# Altium integrated library Mastermind Devices.IntLib: 910 symbols (part 2 of 6)

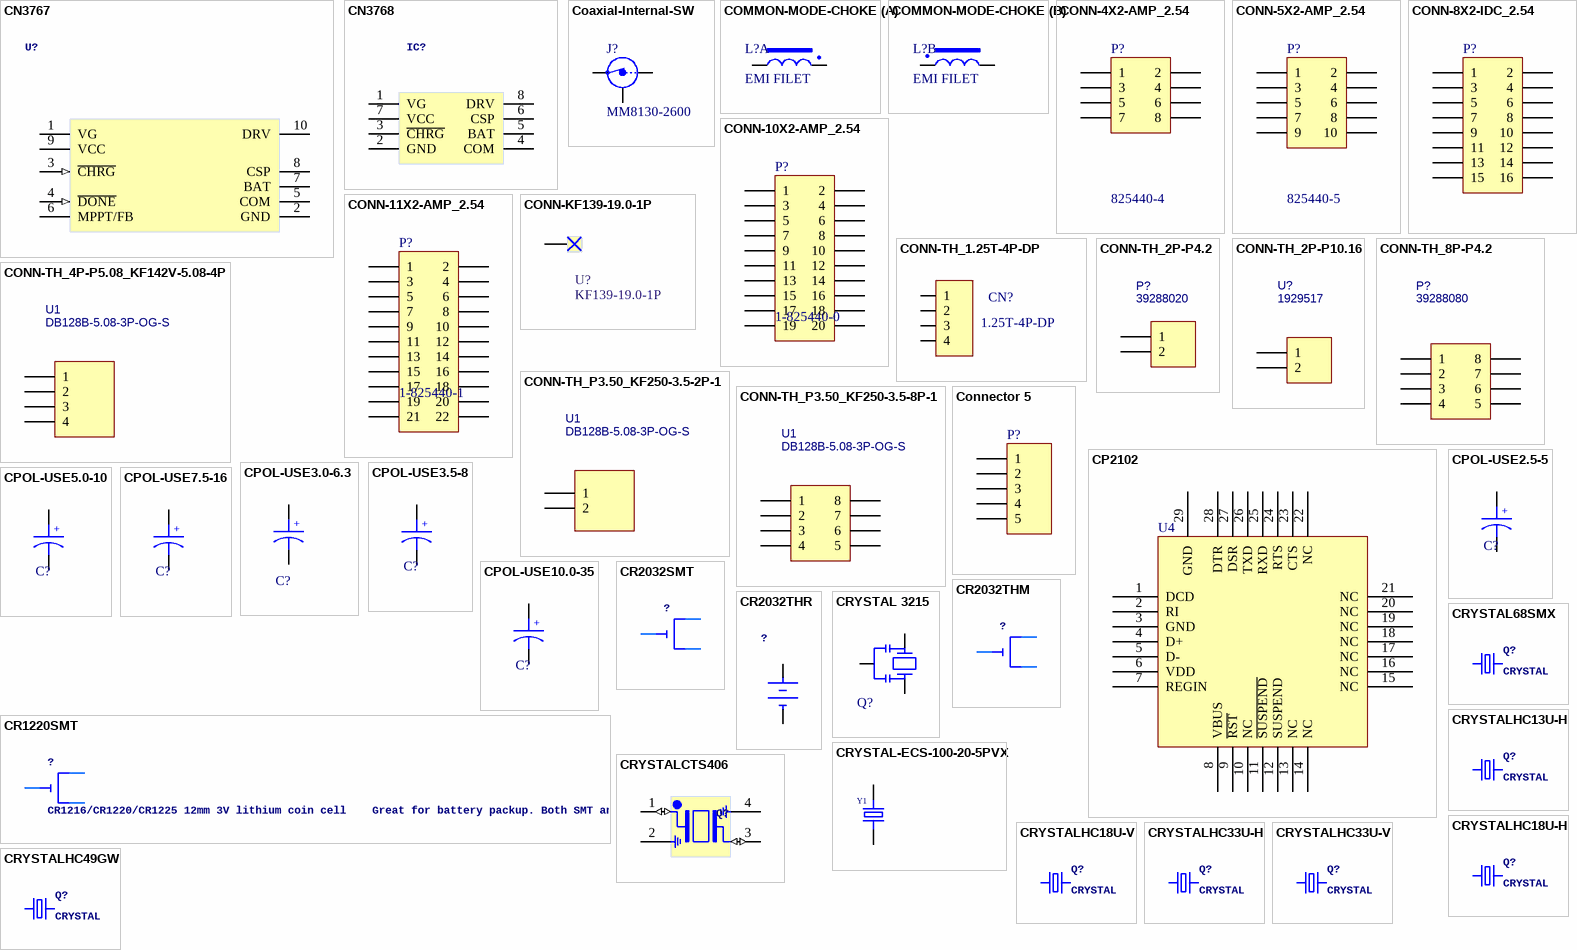
[diagram p8: symbols CN3767 to CRYSTALHC49GW]

## CN3767
designator U?, comment Battey Charger  (value not drawn)
footprint SOIC10 0P600X175-10N
pins: 1 VG, 2 GND, 3 ~{CHRG} (in), 4 ~{DONE} (in), 5 COM (power), 6 MPPT/FB, 7 BAT, 8 CSP (power), 9 VCC, 10 DRV (power)

## CN3768
designator IC?, comment Battey Charger  (value not drawn)
footprint SOP8
pins: 1 VG, 2 GND, 3 ~{CHRG}, 4 COM (power), 5 BAT, 6 CSP (power), 7 VCC, 8 DRV (power)

## Coaxial-Internal-SW
designator J?, comment MM8130-2600
Coaxial Connector with Switch; Manufacturer: Murata; 2nd source part number: 81-MM8130-2600RA2; Artikkelnr Noca: 55029011; Artikkelnr Simpro: N.A.; Part Number: MM8130-2600; Manufacturer Part Number: MM8130-2600; Datasheet: http://www.murata.com/products/catalog/pdf/o33e.pdf; LatestRevisionDate: 2014-04-24; Pin Count: 3; Publisher: Nordic Semiconductor; Published: 2014-04-24; Value: MM8130-2600; Note: *; Supplier: Digi-Key; Supplier part number: 490-4981-1-ND; 2nd source Supplier: Mouser; Footprint Doc: COAXIAL-SWF
footprint COAXIAL-SWF
pins: 1 IN, 2 Shield, 3 OUT

## COMMON-MODE-CHOKE
designator L?, comment EMI FILET
Common Mode Noise Filter
footprint EMI Core
footprint EMI Z0021A
footprint COMMON-IND_30.0
part A pins: 1, 3
part B pins: 2, 4

## CONN-4X2-AMP_2.54
designator P?, comment 825440-4
TE Connectivity AMP Connectors; LatestRevisionDate: 17-Jul-2002; LatestRevisionNote: Re-released for DXP Platform.; Publisher: Altium Limited
signal-integrity model Connector
footprint CONN2X4-AMP (Connector; Header; 5x2 Position)
pins: 1, 2, 3, 4, 5, 6, 7, 8

## CONN-5X2-AMP_2.54
designator P?, comment 825440-5
TE Connectivity AMP Connectors; LatestRevisionDate: 17-Jul-2002; LatestRevisionNote: Re-released for DXP Platform.; Publisher: Altium Limited
signal-integrity model Connector
footprint CONN2X5-AMP (Connector; Header; 5x2 Position)
pins: 1, 2, 3, 4, 5, 6, 7, 8, 9, 10

## CONN-8X2-IDC_2.54
designator P?
IDC Connector; LatestRevisionDate: 17-Jul-2002; LatestRevisionNote: Re-released for DXP Platform.; Publisher: Altium Limited
signal-integrity model Connector
footprint 2X08_SHROUDED
pins: 1, 2, 3, 4, 5, 6, 7, 8, 9, 10, 11, 12, 13, 14, 15, 16

## CONN-10X2-AMP_2.54
designator P?, comment 1-825440-0
TE Connectivity AMP Connectors; LatestRevisionDate: 17-Jul-2002; LatestRevisionNote: Re-released for DXP Platform.; Publisher: Altium Limited
signal-integrity model Connector
footprint CONN2X10-AMP
pins: 1, 2, 3, 4, 5, 6, 7, 8, 9, 10, 11, 12, 13, 14, 15, 16, 17, 18, 19, 20

## CONN-11X2-AMP_2.54
designator P?, comment 1-825440-1
TE Connectivity AMP Connectors; LatestRevisionDate: 17-Jul-2002; LatestRevisionNote: Re-released for DXP Platform.; Publisher: Altium Limited
signal-integrity model Connector
footprint CONN2X11-AMP
pins: 1, 2, 3, 4, 5, 6, 7, 8, 9, 10, 11, 12, 13, 14, 15, 16, 17, 18, 19, 20, 21, 22

## CONN-KF139-19.0-1P
designator U?, comment KF139-19.0-1P
Manufacturer: KEFA(科发); Add into BOM: yes; Symbol: KF139-19.0-1P; Device: KF139-19.0-1P; LCSC Part Name: KF139-19.0-1P; Supplier Part: C6392812; Manufacturer Part: KF139-19.0-1P; Supplier Footprint: 插件; JLCPCB Part Class: Extended Part; Datasheet: https://atta.szlcsc.com/upload/public/pdf/source/20230523/9EEA11B50F6D876494A3C4E93D93D143.pdf; Supplier: LCSC; Convert to PCB: yes
footprint CONN-TH_KF139-19.0-1P
pins: 1

## CONN-TH_1.25T-4P-DP
designator CN?, comment 1.25T-4P-DP
CONN-TH_4P-P1.25_1.25T-4P-DP; Manufacturer: 韩国韩荣; Add into BOM: yes; Pins Structure: 1x4P; Pitch: 1.25mm; Number of PINs Per Row: 4; Symbol: 1.25T-4P-DP; Device: 1.25T-4P-DP; LCSC Part Name: 1x4P 间距:1.25mm; Supplier Part: C145936; Manufacturer Part: 1.25T-4P-DP; Supplier Footprint: 插件,P=1.25mm; JLCPCB Part Class: Extended Part; Datasheet: https://atta.szlcsc.com/upload/public/pdf/source/20210511/C145936_7E552BBBEA0510A148F12D708BF3BB1D.pdf; Supplier: LCSC; Convert to PCB: yes; Mounting Style: -; Reference Series: -; Number of Pins: 4P; Number of Rows: 1; Row Spacing: -; Contact Material: Phosphor bronze
footprint CONN-TH_4P-P1.25_1.25T-4P-DP
pins: 1, 2, 3, 4

## CONN-TH_2P-P4.2
designator P?, comment 39288020
MOLEX Pow CONN; Contributor: LCSC; Supplier: LCSC; Supplier Part: C490534; Manufacturer: MOLEX; Manufacturer Part: 39288020; JLCPCB Part Class: Extended Part; spicePre: C; spiceSymbolName: 39288020
footprint CONN-TH_39288020
pins: 1, 2

## CONN-TH_2P-P10.16
designator U?, comment 1929517
60A 600V Green Straight 10.16mm 1 2 Plugin,P=10.16mm Screw terminal ROHS; BOM_Manufacturer: DIBO; BOM_Manufacturer Part: DB128B-5.08-3P-OG-S; Contributor: LCSC; BOM_Supplier: LCSC; BOM_Supplier Part: C500034; BOM_JLCPCB Part Class: Extended Part; spicePre: U; spiceSymbolName: DB128B-5.08-3P-OG-S
footprint CONN-TH_KF139-19.0-2P
pins: 1, 2

## CONN-TH_4P-P5.08_KF142V-5.08-4P
designator U1, comment DB128B-5.08-3P-OG-S
BOM_Manufacturer: DIBO; Contributor: LCSC; BOM_Supplier: LCSC; BOM_Supplier Part: C500034; BOM_Manufacturer Part: DB128B-5.08-3P-OG-S; BOM_JLCPCB Part Class: Extended Part; spicePre: U; spiceSymbolName: DB128B-5.08-3P-OG-S
footprint CONN-TH_4P-P5.08_KF142V-5.08-4P
pins: 1, 2, 3, 4

## CONN-TH_8P-P4.2
designator P?, comment 39288080
Molex POW CONN; Contributor: LCSC; Supplier: LCSC; Supplier Part: C505059; Manufacturer: MOLEX; Manufacturer Part: 39288080; JLCPCB Part Class: Extended Part; spicePre: C; spiceSymbolName: 39288080
footprint CONN-TH_39288080
pins: 1, 2, 3, 4, 5, 6, 7, 8

## CONN-TH_P3.50_KF250-3.5-2P-1
designator U1, comment DB128B-5.08-3P-OG-S
BOM_Manufacturer: DIBO; Contributor: LCSC; BOM_Supplier: LCSC; BOM_Supplier Part: C500034; BOM_Manufacturer Part: DB128B-5.08-3P-OG-S; BOM_JLCPCB Part Class: Extended Part; spicePre: U; spiceSymbolName: DB128B-5.08-3P-OG-S
footprint CONN-TH_P3.50_KF250-3.5-2P-1
pins: 1, 2

## CONN-TH_P3.50_KF250-3.5-8P-1
designator U1, comment DB128B-5.08-3P-OG-S
BOM_Manufacturer: DIBO; Contributor: LCSC; BOM_Supplier: LCSC; BOM_Supplier Part: C500034; BOM_Manufacturer Part: DB128B-5.08-3P-OG-S; BOM_JLCPCB Part Class: Extended Part; spicePre: U; spiceSymbolName: DB128B-5.08-3P-OG-S
footprint CONN-TH_8P-P2.54_KF141V-2.54-8P
pins: 1, 2, 3, 4, 5, 6, 7, 8

## Connector 5
designator P?
XH Header Male Pin 0.100; LatestRevisionDate: 17-Jul-2002; LatestRevisionNote: Re-released for DXP Platform.; Publisher: Altium Limited; JLCPCB#: C146121
signal-integrity model Connector
footprint JST-5-PTH-KIT
footprint JST-5-PTH-ST
footprint JST-5-PTH-KIT - SMD
pins: 1, 2, 3, 4, 5

## CP2102
designator U4
CP2102
footprint QFN28
pins: 1 DCD, 2 RI, 3 GND, 4 D+, 5 D-, 6 VDD, 7 REGIN, 8 VBUS, 9 ~{RST}, 10 NC, 11 ~{SUSPEND}, 12 SUSPEND, 13 NC, 14 NC, 15 NC, 16 NC, 17 NC, 18 NC, 19 NC, 20 NC, 21 NC, 22 NC, 23 CTS, 24 RTS, 25 RXD, 26 TXD, 27 DSR, 28 DTR, 29 GND

## CPOL-USE2.5-5
designator C?, comment 47uF  (value not drawn)
footprint E2,5-5
pins: +, -

## CPOL-USE3.0-6.3
designator C?, comment 47uF  (value not drawn)
footprint E2,5-6.3
pins: +, -

## CPOL-USE3.5-8
designator C?, comment 1000Uf  (value not drawn)
footprint E3,5-8
footprint E3,17-8 -NoOutline
pins: +, -

## CPOL-USE5.0-10
designator C?, comment 10uF  (value not drawn)
footprint E3,5-10
pins: +, -

## CPOL-USE7.5-16
designator C?, comment 10uF  (value not drawn)
footprint E7.5-16
pins: +, -

## CPOL-USE10.0-35
designator C?, comment 10uF  (value not drawn)
footprint E10-35
footprint E10-35-Generic
pins: +, -

## CR1220SMT
designator ?, comment CR1216/CR1220/CR1225 12mm 3V lithium coin cell    Great for battery packup. Both SMT and THM holders.  Note the THM package has the ground pads on both sides of the PCB so that the masks are the same - this reduces the cost
footprint CR1220-SMD
pins: +$1 +, +$2 +1, -

## CR2032SMT
designator ?
footprint CR2032-SMD
pins: +$1 +, +$2 +1, -

## CR2032THM
designator ?
footprint CR2032-THRU
footprint CR2032_HOLDER_SMD
pins: +, +, -

## CR2032THR
designator ?
footprint CR2032_HOLDER_SMD
footprint CR2032-THRUHOLE
pins: +, -

## CRYSTAL68SMX
designator Q?, comment CRYSTAL
OC_FARNELL: 6344860; OC_NEWARK: unknown
footprint 86SMX
pins: 1, 4 2

## CRYSTAL 3215
designator Q?, comment 16MHz  (value not drawn)
Crystal Osscilator; OC_FARNELL: unknown; OC_NEWARK: unknown
footprint CSTCE16M 3215
pins: 1, 2, 3

## CRYSTAL-ECS-100-20-5PVX
designator Y1, comment crystal  (value not drawn)
10MHz Â±30ppm Crystal 20pF 60 Ohms HC-49/US; MP: ECS-100-20-5PVX; MF: ECS Inc.; Availability: Warning; SnapEDA_Link: https://www.snapeda.com/parts/ECS-100-20-5PVX/ECS%20Inc./view-part/2721546/?ref=snap; Value: *; Price: None; Package: HC49/US ECS International; Check_prices: https://www.snapeda.com/parts/ECS-100-20-5PVX/ECS%20Inc./view-part/2721546/?ref=eda
footprint HC-49US_L11.5-W4.5-P4.88
footprint OSC-SMD_2P-L5.0-W3.2
footprint XTAL1
pins: 1, 2

## CRYSTALCTS406
designator Q?, comment CRYSTAL  (value not drawn)
CRYSTALCTS406; OC_FARNELL: unknown; OC_NEWARK: unknown; Parameter 1: *
footprint 3225
footprint CRYSTAL-SMD_4P-L3.2-W2.5-BL-2
footprint OSC-SMD_4P-L2.0-W1.6-BL
footprint CRYSTAL-SMD_4P-L2.5-W2.0-BL-A
pins: 1 IN (io), 2 GND, 3 OUT (io), 4 GND

## CRYSTALHC13U-H
designator Q?, comment CRYSTAL
OC_FARNELL: unknown; OC_NEWARK: unknown
footprint HC13U-H
pins: 1, 2

## CRYSTALHC18U-H
designator Q?, comment CRYSTAL
OC_FARNELL: unknown; OC_NEWARK: unknown
footprint HC18U-H
pins: 1, 2

## CRYSTALHC18U-V
designator Q?, comment CRYSTAL
OC_FARNELL: unknown; OC_NEWARK: unknown
footprint HC18U-V
pins: 1, 2

## CRYSTALHC33U-H
designator Q?, comment CRYSTAL
OC_FARNELL: unknown; OC_NEWARK: unknown
footprint HC33U-H
pins: 1, 2

## CRYSTALHC33U-V
designator Q?, comment CRYSTAL
OC_FARNELL: unknown; OC_NEWARK: unknown
footprint HC33U-V
pins: 1, 2

## CRYSTALHC49GW
designator Q?, comment CRYSTAL
OC_FARNELL: unknown; OC_NEWARK: unknown
footprint HC49GW
pins: 1, 2

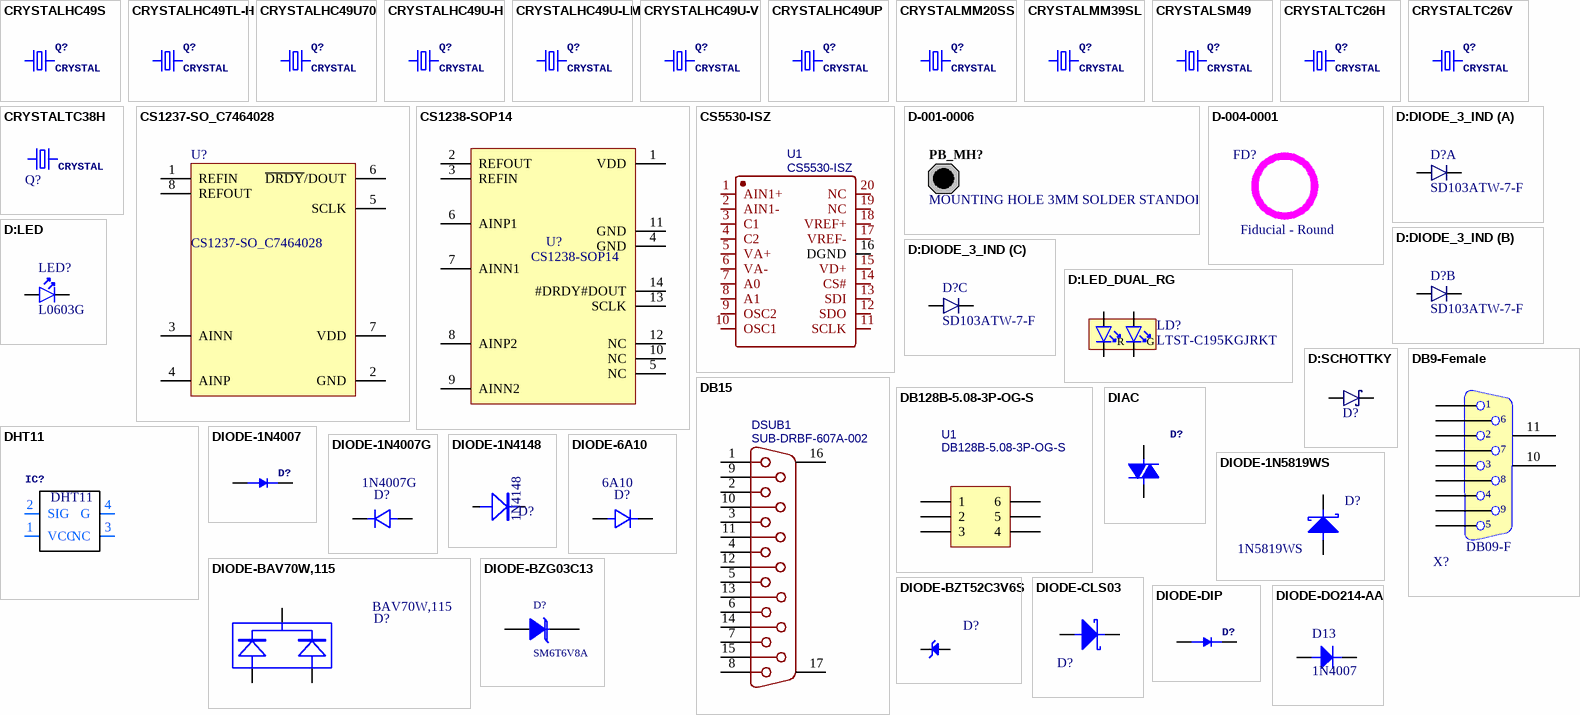
[diagram p9: symbols CRYSTALHC49S to DIODE-DO214-AA]

## CRYSTALHC49S
designator Q?, comment CRYSTAL
OC_FARNELL: 1667008; OC_NEWARK: unknown
footprint HC49/S
pins: 1, 2

## CRYSTALHC49TL-H
designator Q?, comment CRYSTAL
OC_FARNELL: unknown; OC_NEWARK: unknown
footprint HC49TL-H
pins: 1, 2

## CRYSTALHC49U70
designator Q?, comment CRYSTAL
OC_FARNELL: unknown; OC_NEWARK: unknown
footprint HC49U70
pins: 1, 2

## CRYSTALHC49U-H
designator Q?, comment CRYSTAL
OC_FARNELL: 1666973; OC_NEWARK: unknown
footprint HC49U-H
pins: 1, 2

## CRYSTALHC49U-LM
designator Q?, comment CRYSTAL
OC_FARNELL: 1666956; OC_NEWARK: unknown
footprint HC49U-LM
pins: 1, 2

## CRYSTALHC49U-V
designator Q?, comment CRYSTAL
OC_FARNELL: 1666969; OC_NEWARK: unknown
footprint HC49U-V
pins: 1, 2

## CRYSTALHC49UP
designator Q?, comment CRYSTAL
OC_FARNELL: unknown; OC_NEWARK: unknown
footprint HC49UP
pins: 1, 2

## CRYSTALMM20SS
designator Q?, comment CRYSTAL
OC_FARNELL: unknown; OC_NEWARK: unknown
footprint MM20SS
pins: 1, 4 2

## CRYSTALMM39SL
designator Q?, comment CRYSTAL
OC_FARNELL: unknown; OC_NEWARK: unknown
footprint MM39SL
pins: 1, 4 2

## CRYSTALSM49
designator Q?, comment CRYSTAL
OC_FARNELL: unknown; OC_NEWARK: unknown
footprint SM49
pins: 1, 2

## CRYSTALTC26H
designator Q?, comment CRYSTAL
OC_FARNELL: unknown; OC_NEWARK: unknown
footprint TC26H
pins: 1, 2

## CRYSTALTC26V
designator Q?, comment CRYSTAL
OC_FARNELL: unknown; OC_NEWARK: unknown
footprint TC26V
pins: 1, 2

## CRYSTALTC38H
designator Q?, comment CRYSTAL
OC_FARNELL: unknown; OC_NEWARK: unknown
footprint TC38H
footprint TC38H - SMD
pins: 1, 2

## CS1237-SO_C7464028
designator U?
CS1237 24-Bit High Precision ADC with Delta-Sigma Modulator; Manufacturer: CHIPSEA(芯海科技); Contributor: lcsc; Supplier: LCSC; Supplier Part: C7464028; Manufacturer Part: CS1237-SO; JLCPCB Part Class: Extended Part; spicePre: U; spiceSymbolName: CS1237-SO_C7464028
footprint SOIC-8E (SOIC, 8-Leads, Body 4.90x3.90mm, Pitch 1.27mm, IPC Medium Density)
pins: 1 REFIN, 2 GND, 3 AINN, 4 AINP, 5 SCLK, 6 ~{DRDY}/DOUT, 7 VDD, 8 REFOUT

## CS1238-SOP14
designator U?
Manufacturer: CHIPSEA(芯海科技); Symbol: CS1238; Add into BOM: yes; Device: CS1238-SOP14; LCSC Part Name: CS1238-SO; Supplier Part: C81829; Manufacturer Part: CS1238-SOP14; Supplier Footprint: SOP-14; JLCPCB Part Class: Extended Part; Datasheet: https://atta.szlcsc.com/upload/public/pdf/source/20160919/1474265371144.pdf; Supplier: LCSC; Convert to PCB: yes
footprint SOP-14_L8.6-W3.9-P1.27-LS6.0-BL
pins: 1 VDD, 2 REFOUT, 3 REFIN, 4 GND, 5 NC, 6 AINP1, 7 AINN1, 8 AINP2, 9 AINN2, 10 NC, 11 GND, 12 NC, 13 SCLK, 14 #DRDY#DOUT

## CS5530-ISZ
designator U1
BOM_Manufacturer: Cirrus Logic(凌云); spicePre: X; BOM_Manufacturer Part: CS5530-ISZ; BOM_Supplier: LCSC; BOM_Supplier Part: C9929; BOM_JLCPCB Part Class: Extended Part; spiceSymbolName: CS5530-ISZ
footprint SSOP-20_L7.2-W5.3-P0.65-LS7.8-BL
pins: 1 AIN1+, 2 AIN1-, 3 C1, 4 C2, 5 VA+, 6 VA-, 7 A0, 8 A1, 9 OSC2, 10 OSC1, 11 SCLK, 12 SDO, 13 SDI, 14 CS#, 15 VD+, 16 DGND, 17 VREF-, 18 VREF+, 19 NC, 20 NC

## D-001-0006
designator PB_MH?, comment MOUNTING HOLE 3MM SOLDER STANDOFF  (no BOM)
Mounting Hole for Solder Standoff, M3 Screw, Plated, Round Pad; Category: Mounting-Hole; Status: Production
footprint STANDOFF_SOLDER_3MM
pins: 1 hidden

## D-004-0001
designator FD?, comment Fiducial - Round
Fiducial - Round 1.5mm Top-Bottom; Status: Unreleased; Category: Fiducial
footprint FIDUCIAL ROUND

## D:DIODE_3_IND
designator D?, comment SD103ATW-7-F
Surface Mount Schottky Barrier Diode Array; Manufacturer: Diodes Incorporated; 2nd source part number: 177-3507; Artikkelnr Noca: 10029109; Artikkelnr Simpro: N.A.; Part Number: SD103ATW-7-F; Manufacturer Part Number: SD103ATW-7-F; Datasheet: http://www.diodes.com/datasheets/ds30374.pdf; LatestRevisionDate: 2012-06-15; Publisher: Nordic Semiconductor; Published: 2012-06-15; Value: SD103ATW-7-F; Note: *; Supplier: Digi-Key; Supplier part number: SD103ATW-FDITR-ND; 2nd source Supplier: Farnell; Footprint Doc: SOT-363
footprint SOT-363
part A pins: 1 C1, 6 A1
part B pins: 2 C2, 5 A2
part C pins: 3 C3, 4 A3

## D:LED
designator LED?, comment L0603G
LED SMARTLED GREEN 570NM 0603; Part Number: LG L29K Smartled Green; Manufacturer: Multicomp; Manufacturer Part Number: LG L29K-G2J1-24-Z; Note: 2,24..5.6 mcd, Vfmin=1.7V; Artikkelnr Noca: N.A.; Datasheet: http://www.osram-os.com/Graphics/XPic2/00077107_0.pdf; Footprint Doc: 0603; LatestRevisionDate: 2014-10-28; Pin Count: 2; Publisher: Nordic Semiconductor; Published: 2014-10-28; Value: L0603G; Supplier: Digi-Key; Supplier part number: 475-2709-1-ND; 2nd source Supplier: *; 2nd source part number: *; Artikkelnr Simpro: N.A.
footprint LED_0603_G
pins: 1 C, 2 A

## D:LED_DUAL_RG
designator LD?, comment LTST-C195KGJRKT
Ultra bright AlInGaP Bi-Color LED; Manufacturer: Lite-On Inc; 2nd source part number: 859-LTST-C195KGJRKT; Artikkelnr Noca: 13019145; Artikkelnr Simpro: N.A.; Part Number: LTST-C195KGJRKT; Manufacturer Part Number: LTST-C195KGJRKT; Datasheet: http://media.digikey.com/pdf/Data%20Sheets/Lite-On%20PDFs/LTST-C195KGJRKT.pdf; LatestRevisionDate: 2013-02-11; Pin Count: 4; Publisher: Nordic Semiconductor; Published: 2012-07-05; Value: LTST-C195KGJRKT; Note: *; Supplier: Digi-Key; Supplier part number: 160-1452-1-ND; 2nd source Supplier: Mouser; Footprint Doc: LED_DUAL_0606
footprint LED_DUAL_0606
pins: 1 A2, 2 A1, 3 C2, 4 C1
text: R; G

## D:SCHOTTKY
designator D?, comment 1PS79SB30.115  (value not drawn)
Diode Schottky Vf=0.38, Vr=40V, If=200mA, Ir=500nA; Manufacturer: NXP; Artikkelnr Noca: N.A.; Part Number: 1PS79SB30.115; Manufacturer Part Number: 1PS79SB30.115; Datasheet: http://www.nxp.com/documents/data_sheet/1PS79SB30.pdf; Footprint Doc: SOD-523; LatestRevisionDate: 2014-09-24; Pin Count: 2; Publisher: Nordic Semiconductor; Published: 2014-09-24; Value: 1PS79SB30.115; Note: *; Supplier: Digi-Key; Supplier part number: 568-5973-1-ND; 2nd source Supplier: *; 2nd source part number: *; Artikkelnr Simpro: N.A.
footprint SOD-523
pins: A, K C

## DB9-Female
designator X?, comment SUB-D  (value not drawn)
GateName_1: G$1; SymbolName_1: F09; DeviceName: H; LibraryName: con-subd; DeviceSetName: F09; Package: F09H; OC_FARNELL: unknown; OC_NEWARK: unknown
footprint DB9-F
pins: 1, 2, 3, 4, 5, 6, 7, 8, 9, 10 1, 11 1
text: DB09-F

## DB15
designator DSUB1, comment SUB-DRBF-607A-002
BOM_Manufacturer: Nextron(正凌); Contributor: LCSC; BOM_Supplier: LCSC; BOM_Supplier Part: C2846090; BOM_Manufacturer Part: SUB-DRBF-607A-002; BOM_JLCPCB Part Class: Extended Part; spicePre: D; spiceSymbolName: SUB-DRBF-607A-002
footprint DSUB-TH_FDB1502-F0DB300K6KA-Female
footprint DSUB-TH_FDB1502-F0DB300K6KA-Male
pins: 1, 2, 3, 4, 5, 6, 7, 8, 9, 10, 11, 12, 13, 14, 15, 16 MH2, 17 MH1

## DB128B-5.08-3P-OG-S
designator U1
BOM_Manufacturer: DIBO; Contributor: LCSC; BOM_Supplier: LCSC; BOM_Supplier Part: C500034; BOM_Manufacturer Part: DB128B-5.08-3P-OG-S; BOM_JLCPCB Part Class: Extended Part; spicePre: U; spiceSymbolName: DB128B-5.08-3P-OG-S
footprint CONN-TH_DB128B-5.08-3P-XX-S
footprint CONN-TH_KF250T-5.0-2X3P
pins: 1, 2, 3, 4, 5, 6

## DHT11
designator IC?, comment TIMERChanged DIP package to have round (not oval) pin pads    http://www.ladyada.net/library/pcb/eaglelibrary.html
footprint DHT11
pins: 1 VCC (power), 2 SIG, 3 NC (power), 4 G

## DIAC
designator D?, comment Diac  (value not drawn)
footprint TO220DS
pins: T1 A1, T2 A2

## DIODE-1N4007
designator D?
DIODE   General purpose 1N400x type rectifier    (With bigger pads)   http://www.ladyada.net/library/pcb/eaglelibrary.html
footprint DO41-10
pins: A, C

## DIODE-1N4007G
designator D?, comment 1N4007G
Manufacturer: onsemi(安森美); Symbol: 1N4007G_C232439; Add into BOM: yes; Voltage - Forward(Vf@If): 930mV@1A; Voltage - DC Reverse(Vr): 1kV; Current - Rectified: 1A; Reverse Leakage Current (Ir): 50nA@1kV; Non-Repetitive Peak Forward Surge Current: 30A; Operating Junction Temperature Range: -65℃~+175℃; Device: 1N4007G_C232439; LCSC Part Name: 1N4007G; Supplier Part: C232439; Manufacturer Part: 1N4007G; Supplier Footprint: DO-41; JLCPCB Part Class: Extended Part; Datasheet: https://item.szlcsc.com/datasheet/1N4007G/232362.html; Supplier: LCSC; Convert to PCB: yes; Diode Configuration: -
footprint DO-41_BD2.4-L4.7-P8.70-D0.9-RD
3D model DO-41_D2.4-L4.7-P8.70
pins: 1, 2

## DIODE-1N4148
designator D?, comment 1N4148
footprint DO-1N4148
footprint DO100-AA
footprint DO-1N4148 - 10mm
footprint SOD-323
footprint SOD-523
footprint DO-35_BD2.0-L4.2-P8.20-D0.5-RD
pins: A, K

## DIODE-1N5819WS
designator D?, comment 1N5819WS
25A 40V 600mV@1A 1A SOD-323 Schottky Diodes ROHS
footprint SOD-323
pins: A, K C

## DIODE-6A10
designator D?, comment 6A10
Manufacturer: onsemi(安森美); Manufacturer Part: 1N4007G; Symbol: 1N4007G_C232439; Add into BOM: yes; Voltage - Forward(Vf@If): 930mV@1A; Voltage - DC Reverse(Vr): 1kV; Current - Rectified: 1A; Reverse Leakage Current (Ir): 50nA@1kV; Non-Repetitive Peak Forward Surge Current: 30A; Operating Junction Temperature Range: -65℃~+175℃; Device: 1N4007G_C232439; LCSC Part Name: 1N4007G; Supplier Part: C232439; Supplier Footprint: DO-41; JLCPCB Part Class: Extended Part; Datasheet: https://item.szlcsc.com/datasheet/1N4007G/232362.html; Supplier: LCSC; Convert to PCB: yes; Diode Configuration: -
footprint R-6_BD9.0-L9.0-W9.0-P15.00-D1.7-FD
pins: 1, 2

## DIODE-BAV70W,115
designator D?, comment BAV70W,115
Manufacturer: Nexperia(安世); Add into BOM: yes; Forward Voltage (Vf@If): 1.25V@150mA; Reverse Leakage Current: 500nA@80V; Symbol: BAV70W,115; Device: BAV70W,115; LCSC Part Name: 电压:100V 电流:175mA; Supplier Part: C28064; Manufacturer Part: BAV70W,115; Supplier Footprint: SOT-323-3; JLCPCB Part Class: Extended Part; Datasheet: https://atta.szlcsc.com/upload/public/pdf/source/20140314/1457707018750.pdf; Supplier: LCSC; Convert to PCB: yes; Operating Temperature: -
footprint SOT23
pins: 1 A, 2 A, 3 K

## DIODE-BZG03C13
designator D?, comment SM6T6V8A
Zener TVS, 6.2V, 5W; Manufacturer: Microsemi; Revision: 31-Oct-2003
footprint DO214
pins: 1 A, 2 K

## DIODE-BZT52C3V6S
designator D?, comment BZT52C3V6S/W4  (value not drawn)
Independent Type 200mW 3.6V~3.8V 3.4V SOD-323 Zener Diodes ROHS; Manufacturer: YFW(佑风微); Symbol: BZT52C3V6S_C5270767; Add into BOM: yes; Reverse Leakage Current (Ir): 5uA@1V; Zener Impedance (Zzt): 90Ω; Device: BZT52C3V6S_C5270767; LCSC Part Name: BZT52C3V6S; Manufacturer Part: BZT52C3V6S; Supplier Footprint: SOD-323; JLCPCB Part Class: Extended Part; Datasheet: https://atta.szlcsc.com/upload/public/pdf/source/20221116/07630275E16F5BD1867C326257346985.pdf; Supplier: LCSC; Convert to PCB: yes; Diode Configuration: Independent Type; Zener Voltage (Nom): 3.4V; Zener Voltage (Range): 3.6V~3.8V; Power Dissipation: 200mW; Supplier Part: C5270767
footprint SOD-323
pins: A (power), K C (power)

## DIODE-CLS03
designator D?, comment CLS03  (value not drawn)
Diode; Designator: *
footprint SMC_L5.9-W4.1-LS8.7-RD
pins: 1 C, 2 A

## DIODE-DIP
designator D?